# Altium footprint library BBB_Cape_template.PcbLib: 5 footprints
Each footprint in its own frame and in the unit in brackets; x right, y up, seen from the top. Pads: shape width x height; smd on the part's side, far side on the other; paste and mask are expansions set on the pad; w line width, h text height; cw(c..) or ccw(c..) is an arc to the next point about the centre after c.
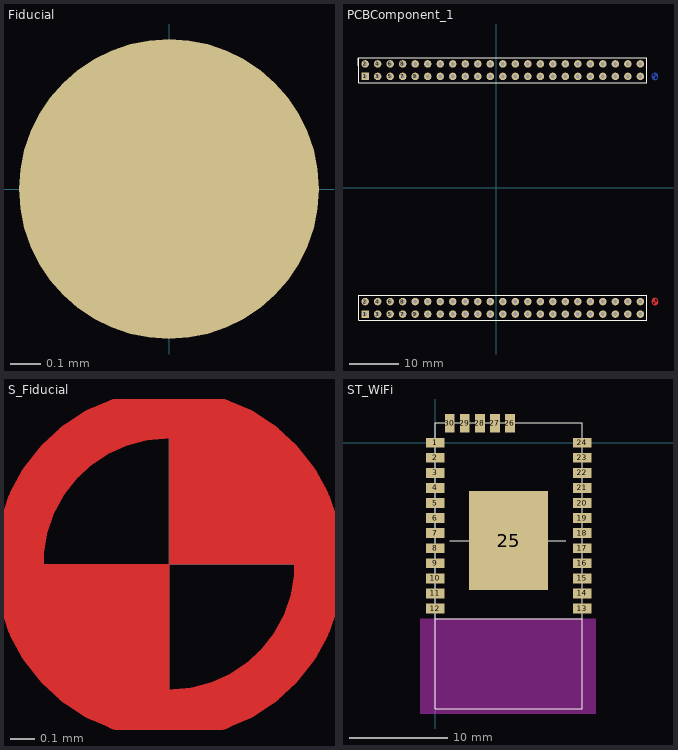
[diagram p0: the footprints below, top view; thin cyan lines are the x and y axes]

## BeagleBone Black 3D [mil] "BeagleBone Black 3D"
3D body: height 545, standoff -217.65, extent 0.51,-0.97 3561.53,2150.98

## Fiducial [mm] "Fiducial"
height 1
pads (1):
  round 1 smd paste-1 mask+0.5: ""(0,0)
3D body: height 0.5, standoff -0.5, extent -0.495,-0.498 0.5,0.498

## PCBComponent_1 [mil]
pads (92):
  rect 60x60 hole 30 mask+2: 1(-1048.92,-1010.17) 1(-1048.92,889.83)
  round 60 hole 30 mask+2: 2(-1048.92,-910.17) 2(-1048.92,989.83) 3(-948.92,-1010.17) 3(-948.92,889.83) 4(-948.92,-910.17) 4(-948.92,989.83) 5(-848.92,-1010.17) 5(-848.92,889.83) 6(-848.92,-910.17) 6(-848.92,989.83) 7(-748.92,-1010.17) 7(-748.92,889.83) 8(-748.92,-910.17) 8(-748.92,989.83) 9(-648.92,-1010.17) 9(-648.92,889.83) 10(-648.92,-910.17) 10(-648.92,989.83) 11(-548.92,-1010.17) 11(-548.92,889.83) 12(-548.92,-910.17) 12(-548.92,989.83) 13(-448.92,-1010.17) 13(-448.92,889.83) 14(-448.92,-910.17) 14(-448.92,989.83) 15(-348.92,-1010.17) 15(-348.92,889.83) 16(-348.92,-910.17) 16(-348.92,989.83) 17(-248.92,-1010.17) 17(-248.92,889.83) 18(-248.92,-910.17) 18(-248.92,989.83) 19(-148.92,-1010.17) 19(-148.92,889.83) 20(-148.92,-910.17) 20(-148.92,989.83) 21(-48.92,-1010.17) 21(-48.92,889.83) 22(-48.92,-910.17) 22(-48.92,989.83) 23(51.08,-1010.17) 23(51.08,889.83) 24(51.08,-910.17) 24(51.08,989.83) 25(151.08,-1010.17) 25(151.08,889.83) 26(151.08,-910.17) 26(151.08,989.83) 27(251.08,-1010.17) 27(251.08,889.83) 28(251.08,-910.17) 28(251.08,989.83) 29(351.08,-1010.17) 29(351.08,889.83) 30(351.08,-910.17) 30(351.08,989.83) 31(451.08,-1010.17) 31(451.08,889.83) 32(451.08,-910.17) 32(451.08,989.83) 33(551.08,-1010.17) 33(551.08,889.83) 34(551.08,-910.17) 34(551.08,989.83) 35(651.08,-1010.17) 35(651.08,889.83) 36(651.08,-910.17) 36(651.08,989.83) 37(751.08,-1010.17) 37(751.08,889.83) 38(751.08,-910.17) 38(751.08,989.83) 39(851.08,-1010.17) 39(851.08,889.83) 40(851.08,-910.17) 40(851.08,989.83) 41(951.08,-1010.17) 41(951.08,889.83) 42(951.08,-910.17) 42(951.08,989.83) 43(1051.08,-1010.17) 43(1051.08,889.83) 44(1051.08,-910.17) 44(1051.08,989.83) 45(1151.08,-1010.17) 45(1151.08,889.83) 46(1151.08,-910.17) 46(1151.08,989.83)
Top Layer:
  region: 1292.09,-910.16 1287.17,-924.92 1277.32,-934.76 1267.48,-934.76 1267.48,-910.16
  region: 1267.48,-885.55 1267.48,-910.16 1242.87,-910.16 1247.8,-895.39 1257.64,-885.55
  lines w8: 1242.87,-910.16 cw(c1267.48,-910.16) 1292.09,-910.16 cw(c1267.48,-910.16) 1242.87,-910.16
Bottom Layer:
  region: 1292.09,889.84 1287.17,904.61 1277.32,914.45 1267.48,914.45 1267.48,889.84
  region: 1267.48,865.24 1267.48,889.84 1242.87,889.84 1247.8,875.08 1257.64,865.24
  lines w8: 1242.87,889.84 ccw(c1267.48,889.84) 1292.09,889.84 ccw(c1267.48,889.84) 1242.87,889.84
Top Overlay:
  lines w1: -1098.92,-1060.17 -998.92,-1060.17 1201.08,-1060.17 1201.08,-860.17 -998.92,-860.17 -1098.92,-860.17 -1098.92,-1060.17 ; -1098.92,839.83 -998.92,839.83 1201.08,839.83 1201.08,1039.83 -998.92,1039.83 -1098.92,1039.83 -1098.92,839.83
  lines w7.87: -1106.51,973.78 -1106.51,1035.79
Bottom Overlay:
  lines w7.87: -1106.51,973.78 -1106.51,1035.65
  text ".Designator" at 1288.58,914.83 h40
  text ".Designator" at 1288.58,-985.17 h40
Top Solder:
  circle w8: c1267.48,-910.16 r24.61
  region: 1267.48,-885.55 1282.24,-890.47 1292.09,-900.32 1292.09,-920 1282.24,-929.84 1267.48,-934.76 1252.72,-929.84 1247.8,-924.92 1242.87,-910.16 1247.8,-895.39 1257.64,-890.47 1252.72,-890.47 1247.8,-895.39
Bottom Solder:
  circle w8: c1267.48,889.84 r24.61
  region: 1267.48,865.24 1282.24,870.16 1292.09,880 1292.09,899.68 1282.24,909.53 1267.48,914.45 1252.72,909.53 1247.8,904.61 1242.87,889.84 1247.8,875.08 1257.64,870.16 1252.72,870.16 1247.8,875.08

## S_Fiducial [mil] "Fiducial"
Top Layer:
  region: 24.61,0 0,0 0,24.61 14.76,19.68 24.61,9.84
  region: 0,-24.61 -14.76,-19.68 -24.61,-9.84 -24.61,0 0,0
  lines w8: 0,-24.61 cw(c0,0) 0,24.61 cw(c0,0) 0,-24.61
Top Solder:
  circle w8: c0,0 r24.61
  region: 24.61,0 19.68,-14.76 9.84,-24.61 -9.84,-24.61 -19.68,-14.76 -24.61,0 -19.68,14.76 -14.76,19.68 0,24.61 14.76,19.68 19.68,9.84 19.68,14.76 14.76,19.68

## ST_WiFi [mm]
pads (30):
  rect 1.85x1 smd: 1(0,0) 2(0,-1.524) 3(0,-3.048) 4(0,-4.572) 5(0,-6.096) 6(0,-7.62) 7(0,-9.144) 8(0,-10.668) 9(0,-12.192) 10(0,-13.716) 11(0,-15.24) 12(0,-16.764) 13(14.87,-16.764) 14(14.87,-15.24) 15(14.87,-13.716) 16(14.87,-12.192) 17(14.87,-10.668) 18(14.87,-9.144) 19(14.87,-7.62) 20(14.87,-6.096) 21(14.87,-4.572) 22(14.87,-3.048) 23(14.87,-1.524) 24(14.87,0)
  rect 8x10 smd: 25(7.435,-9.9)
  rect 1x1.85 smd: 26(7.566,1.98) 27(6.042,1.98) 28(4.518,1.98) 29(2.994,1.98) 30(1.47,1.98)
Top Overlay:
  lines w0.1: 0,-17.78 14.87,-17.78 ; 1.496,-9.9 13.208,-9.9 ; 0,-26.924 0,2.032 14.87,2.032 14.87,-26.924 0,-26.924
Keep-Out Layer:
  board cut-out: -1.524,-17.78 16.256,-17.78 16.256,-27.432 -1.524,-27.432
3D body: height 2.3, standoff 0.8, extent 0.508,-17.78 14.224,1.524
3D body: height 2.3, standoff 0.8, extent 0,-26.924 14.87,-22.352
3D body: height 0.8, standoff -0.01, extent 0,-26.924 14.87,2.032